# Altium footprint library SparkFun-Retired.PCBLIB: 302 footprints (part 7 of 19)
Each footprint in its own frame and in the unit in brackets; x right, y up, seen from the top. Pads: shape width x height; smd on the part's side, far side on the other; paste and mask are expansions set on the pad; w line width, h text height; cw(c..) or ccw(c..) is an arc to the next point about the centre after c.
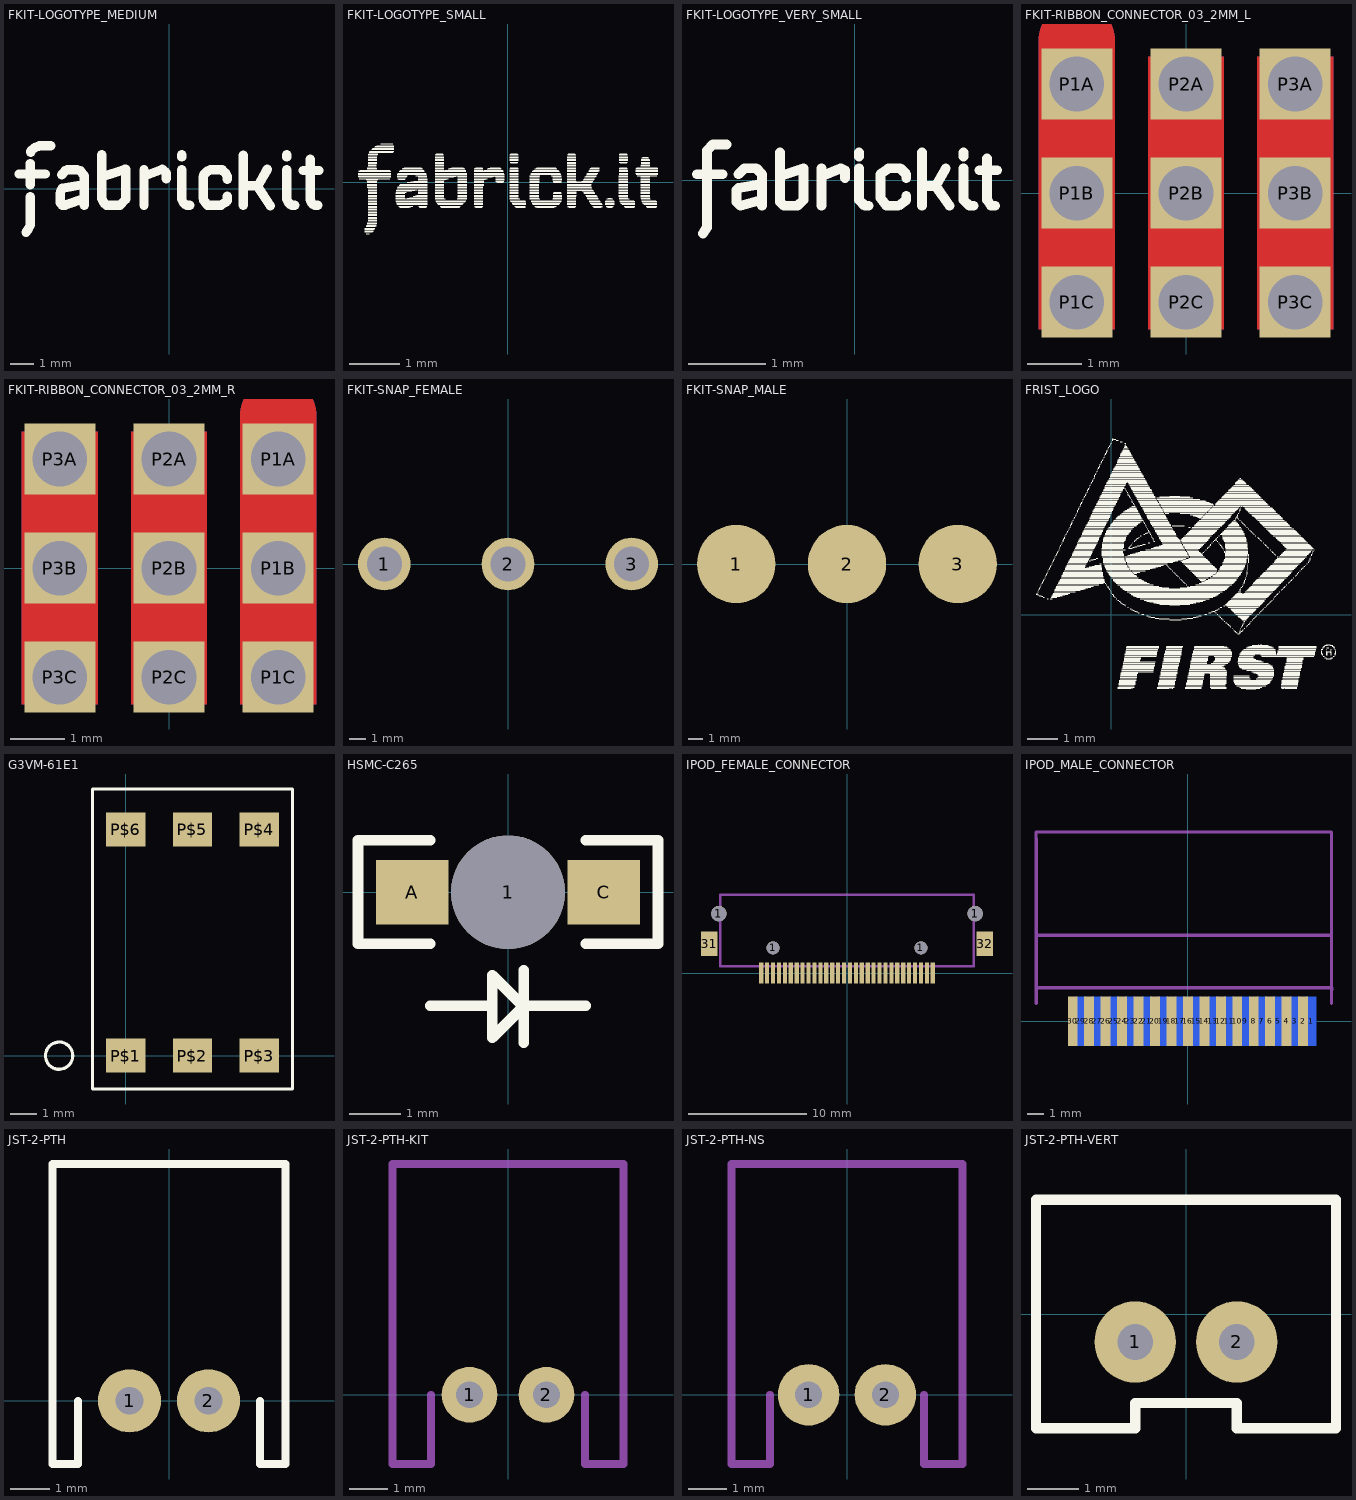
[diagram p6: the footprints below, top view; thin cyan lines are the x and y axes]

## FKIT-LOGOTYPE_MEDIUM [mil]
Top Overlay:
  lines w16: -256,25 -211,25 ; -244,-74 -240,-69 -237,-62 -237,-14 ; -237,7 -237,43 ; -236,62 -236,64 -234,66 -229,70 -221,73 -202,73 ; -183,24 -177,31 -174,32 -157,32 -152,31 -145,22 -145,-17 ; -146,7 -182,1 -185,-4 -186,-9 -186,-24 -182,-28 -177,-28 -145,-17 ; -145,-28 -145,-17 ; -115,58 -115,-17 -111,-25 -107,-28 -84,-28 -74,-18 -74,33 -76,33 -113,21 ; -43,-28 -43,32 ; -41,22 -12,33 -7,29 -5,26 -5,17 ; 21,32 21,-18 25,-25 28,-27 30,-28 35,-28 ; 21,54 21,58 ; 99,-13 99,-20 96,-23 88,-28 65,-28 59,-20 58,-16 58,20 59,24 65,30 70,32 90,32 96,26 99,21 99,16 ; 126,-28 126,57 ; 127,5 151,5 167,33 ; 150,4 172,-29 ; 200,32 200,-18 204,-25 207,-27 209,-28 214,-28 ; 200,54 200,58 ; 228,31 255,31 ; 240,50 240,-19 243,-25 246,-27 248,-28 253,-28

## FKIT-LOGOTYPE_SMALL [mil]
Top Overlay:
  drawing of 972 lines, arcs and shapes, not listed

## FKIT-LOGOTYPE_VERY_SMALL [mil]
Top Overlay:
  lines w5: -80,3 -67,3 ; -77,-27 -75,-24 -75,15 -72,18 -65,18 ; -59,3 -56,6 -50,6 -47,3 -47,-2 ; -47,-13 -47,-10 ; -38,14 -38,2 ; -17,-13 -17,2 ; -17,6 -17,2 ; -5,1 -5,5 -7,6 -17,2 ; 2,6 2,-10 5,-13 7,-13 ; 2,12 2,14 ; 26,-8 26,-10 22,-13 16,-13 13,-9 13,3 17,6 23,6 26,3 26,1 ; 34,-13 34,-3 ; 34,14 34,-3 ; 46,6 41,-3 ; 48,-13 41,-3 ; 55,6 55,-10 58,-13 60,-13 ; 55,12 55,14 ; 63,5 72,5 ; 67,11 67,-10 69,-13 71,-13 ; -47,-10 -47,-2 ; -47,-10 -58,-13 -60,-11 -60,-5 -59,-4 -47,-2 ; -38,2 -38,-11 -36,-13 -29,-13 -26,-10 -26,6 -38,2 ; 34,-3 41,-3

## FKIT-RIBBON_CONNECTOR_03_2MM_L [mm]
pads (9):
  rect 1.3x1.3 hole 1: P1A(-2,2) P1B(-2,0) P1C(-2,-2) P2A(0,2) P2B(0,0) P2C(0,-2) P3A(2,2) P3B(2,0) P3C(2,-2)
Top Layer:
  rectangle: -2.701,-2.5 -1.299,2.5
  rectangle: -0.701,-2.5 0.701,2.5
  rectangle: 1.299,-2.5 2.701,2.5
  lines w1.402: -2,2.5 -2,2.8
Bottom Layer:
  rectangle: -2.701,-2.5 -1.299,2.5
  rectangle: -0.701,-2.5 0.701,2.5
  rectangle: 1.299,-2.5 2.701,2.5
  lines w1.402: -2,2.5 -2,2.8
Top Solder:
  rectangle: -2.75,-2.6 -1.25,2.6
  rectangle: -0.75,-2.6 0.75,2.6
  rectangle: 1.25,-2.6 2.75,2.6
  lines w1.5: -2,2.75 -2,2.8
Bottom Solder:
  rectangle: -2.75,-2.6 -1.25,2.6
  rectangle: -0.75,-2.6 0.75,2.6
  rectangle: 1.25,-2.6 2.75,2.6
  lines w1.5: -2,2.75 -2,2.8

## FKIT-RIBBON_CONNECTOR_03_2MM_R [mm]
pads (9):
  rect 1.3x1.3 hole 1: P1A(2,2) P1B(2,0) P1C(2,-2) P2A(0,2) P2B(0,0) P2C(0,-2) P3A(-2,2) P3B(-2,0) P3C(-2,-2)
Top Layer:
  rectangle: -2.701,-2.5 -1.299,2.5
  rectangle: -0.701,-2.5 0.701,2.5
  rectangle: 1.299,-2.5 2.701,2.5
  lines w1.402: 2,2.5 2,2.8
Bottom Layer:
  rectangle: -2.701,-2.5 -1.299,2.5
  rectangle: -0.701,-2.5 0.701,2.5
  rectangle: 1.299,-2.5 2.701,2.5
  lines w1.402: 2,2.5 2,2.8
Top Solder:
  rectangle: -2.75,-2.6 -1.25,2.6
  rectangle: -0.75,-2.6 0.75,2.6
  rectangle: 1.25,-2.6 2.75,2.6
  lines w1.5: 2,2.75 2,2.8
Bottom Solder:
  rectangle: -2.75,-2.6 -1.25,2.6
  rectangle: -0.75,-2.6 0.75,2.6
  rectangle: 1.25,-2.6 2.75,2.6
  lines w1.5: 2,2.75 2,2.8

## FKIT-SNAP_FEMALE [mil]
pads (3):
  round 127.5 hole 85: 1(-300,0) 2(0,0) 3(300,0)
Top Layer:
  region: 0,0 10,0 10,10 0,10
  region: 0,0 10,0 10,10 0,10
  region: 0,0 10,0 10,10 0,10
Top Paste:
  region: 0,0 10,0 10,10 0,10
  region: 0,0 10,0 10,10 0,10
  region: 0,0 10,0 10,10 0,10
Top Solder:
  region: 0,0 10,0 10,10 0,10
  region: 0,0 10,0 10,10 0,10
  region: 0,0 10,0 10,10 0,10

## FKIT-SNAP_MALE [mil]
pads (3):
  rrect100% 212x212 smd: 1(-300,0) 2(0,0) 3(300,0)

## FRIST_LOGO [mil]
Top Overlay:
  drawing of 1936 lines, arcs and shapes, not listed

## G3VM-61E1 [mm]
pads (6):
  rect 1.5x1.3 smd: P$1(0,0) P$2(2.54,0) P$3(5.08,0) P$4(5.08,8.62) P$5(2.54,8.62) P$6(0,8.62)
Top Overlay:
  circle w0.127: c-2.54,0 r0.519
  lines w0.127: -1.27,-1.27 -1.27,10.16 6.35,10.16 6.35,-1.27 -1.27,-1.27

## HSMC-C265 [mil]
pads (3):
  round 86.61 hole 86.61: 1(0,0)
  rect 55.12x49.21 smd: A(-72.83,0) C(72.83,0)
Top Overlay:
  lines w8: -59.06,-86.61 -11.81,-86.61 ; -59.06,-39.37 -114.17,-39.37 -114.17,39.37 -59.06,39.37 ; 11.81,-114.57 11.81,-87.01 ; 11.81,-59.45 11.81,-86.61 ; 59.06,-86.61 11.81,-86.61 ; 59.06,-39.37 114.17,-39.37 114.17,39.37 59.06,39.37 ; -11.81,-86.61 -11.81,-63.39 11.81,-87.01 ; -11.81,-86.61 -11.81,-110.63 11.81,-87.01 ; 11.81,-87.01 11.81,-86.61

## IPOD_FEMALE_CONNECTOR [mm]
pads (36):
  round 1.3 hole 1.3: 1(-10.825,5.025) 1(10.825,5.025)
  rect 0.35x1.75 smd: 1(-7.25,0) 2(-6.75,0) 3(-6.25,0) 4(-5.75,0) 5(-5.25,0) 6(-4.75,0) 7(-4.25,0) 8(-3.75,0) 9(-3.25,0) 10(-2.75,0) 11(-2.25,0) 12(-1.75,0) 13(-1.25,0) 14(-0.75,0) 15(-0.25,0) 16(0.25,0) 17(0.75,0) 18(1.25,0) 19(1.75,0) 20(2.25,0) 21(2.75,0) 22(3.25,0) 23(3.75,0) 24(4.25,0) 25(4.75,0) 26(5.25,0) 27(5.75,0) 28(6.25,0) 29(6.75,0) 30(7.25,0)
  round 1.1 hole 1.1: 1(-6.25,2.125) 1(6.25,2.125)
  rect 1.4x2.05 smd: 31(-11.65,2.475) 32(11.65,2.475)
Mechanical 16:
  lines w0.203: -10.7,0.575 10.7,0.575 10.7,6.625 -10.7,6.625 -10.7,0.575

## IPOD_MALE_CONNECTOR [mm]
pads (30):
  rect 0.6x3 smd far side: 1(7.5,0) 3(6.5,0) 5(5.5,0) 7(4.5,0) 9(3.5,0) 11(2.5,0) 13(1.5,0) 15(0.5,0) 17(-0.5,0) 19(-1.5,0) 21(-2.5,0) 23(-3.5,0) 25(-4.5,0) 27(-5.5,0) 29(-6.5,0)
  rect 0.6x3 smd: 2(7,0) 4(6,0) 6(5,0) 8(4,0) 10(3,0) 12(2,0) 14(1,0) 16(0,0) 18(-1,0) 20(-2,0) 22(-3,0) 24(-4,0) 26(-5,0) 28(-6,0) 30(-7,0)
Mechanical 16:
  lines w0.203: -9.232,5.224 8.727,5.224 8.727,4.883 ; -9.229,2.027 8.733,2.027 8.733,1.914 ; -9.229,11.078 -9.229,11.497 8.727,11.497 8.727,4.883 ; -9.225,1.1 -9.225,11.1 ; 8.725,1.1 8.725,4.1 ; 8.727,4.089 8.727,4.883

## JST-2-PTH [mm]
pads (2):
  round 1.6 hole 0.7: 1(-1,0) 2(1,0)
Top Overlay:
  lines w0.203: -2.3,0 -2.3,-1.6 -2.95,-1.6 -2.95,6 2.95,6 2.95,-1.6 2.3,-1.6 2.3,0
Mechanical 16:
  text "+" at 0.6,0.7 h1.97
  text "-" at -1.4,0.7 h1.97

## JST-2-PTH-KIT [mil]
pads (2):
  round 57 hole 27.56: 1(-39.37,0) 2(39.37,0)
Top Solder:
  region: 0,0 10,0 10,10 0,10
  region: 0,0 10,0 10,10 0,10
Bottom Solder:
  region: 0,0 10,0 10,10 0,10
  region: 0,0 10,0 10,10 0,10
Mechanical 16:
  lines w8: -78.74,0 -78.74,-70.87 -118.11,-70.87 -118.11,236.22 118.11,236.22 118.11,-70.87 78.74,-70.87 78.74,0
  text "+" at 23.62,27.56 h77.5
  text "-" at -55.12,27.56 h77.5

## JST-2-PTH-NS [mm]
pads (2):
  round 1.6 hole 0.7: 1(-1,0) 2(1,0)
Mechanical 16:
  lines w0.203: -2,0 -2,-1.8 -3,-1.8 -3,6 3,6 3,-1.8 2,-1.8 2,0
  text "+" at 0.6,0.7 h1.97
  text "-" at -1.4,0.7 h1.97

## JST-2-PTH-VERT [mm]
pads (2):
  round 1.6 hole 0.7: 1(-1,-0.55) 2(1,-0.55)
Top Overlay:
  lines w0.203: -2.95,-2.25 -2.95,2.25 2.95,2.25 2.95,-2.25 1,-2.25 1,-1.75 -1,-1.75 -1,-2.25 -2.95,-2.25
Mechanical 16:
  text "+" at 0.616,0.75 h1.97
  text "-" at -1.384,0.75 h1.97